# Altium footprint library 常用元件封装库.PcbLib: 1310 footprints (part 42 of 83)
Each footprint in its own frame and in the unit in brackets; x right, y up, seen from the top. Pads: shape width x height; smd on the part's side, far side on the other; paste and mask are expansions set on the pad; w line width, h text height; cw(c..) or ccw(c..) is an arc to the next point about the centre after c.
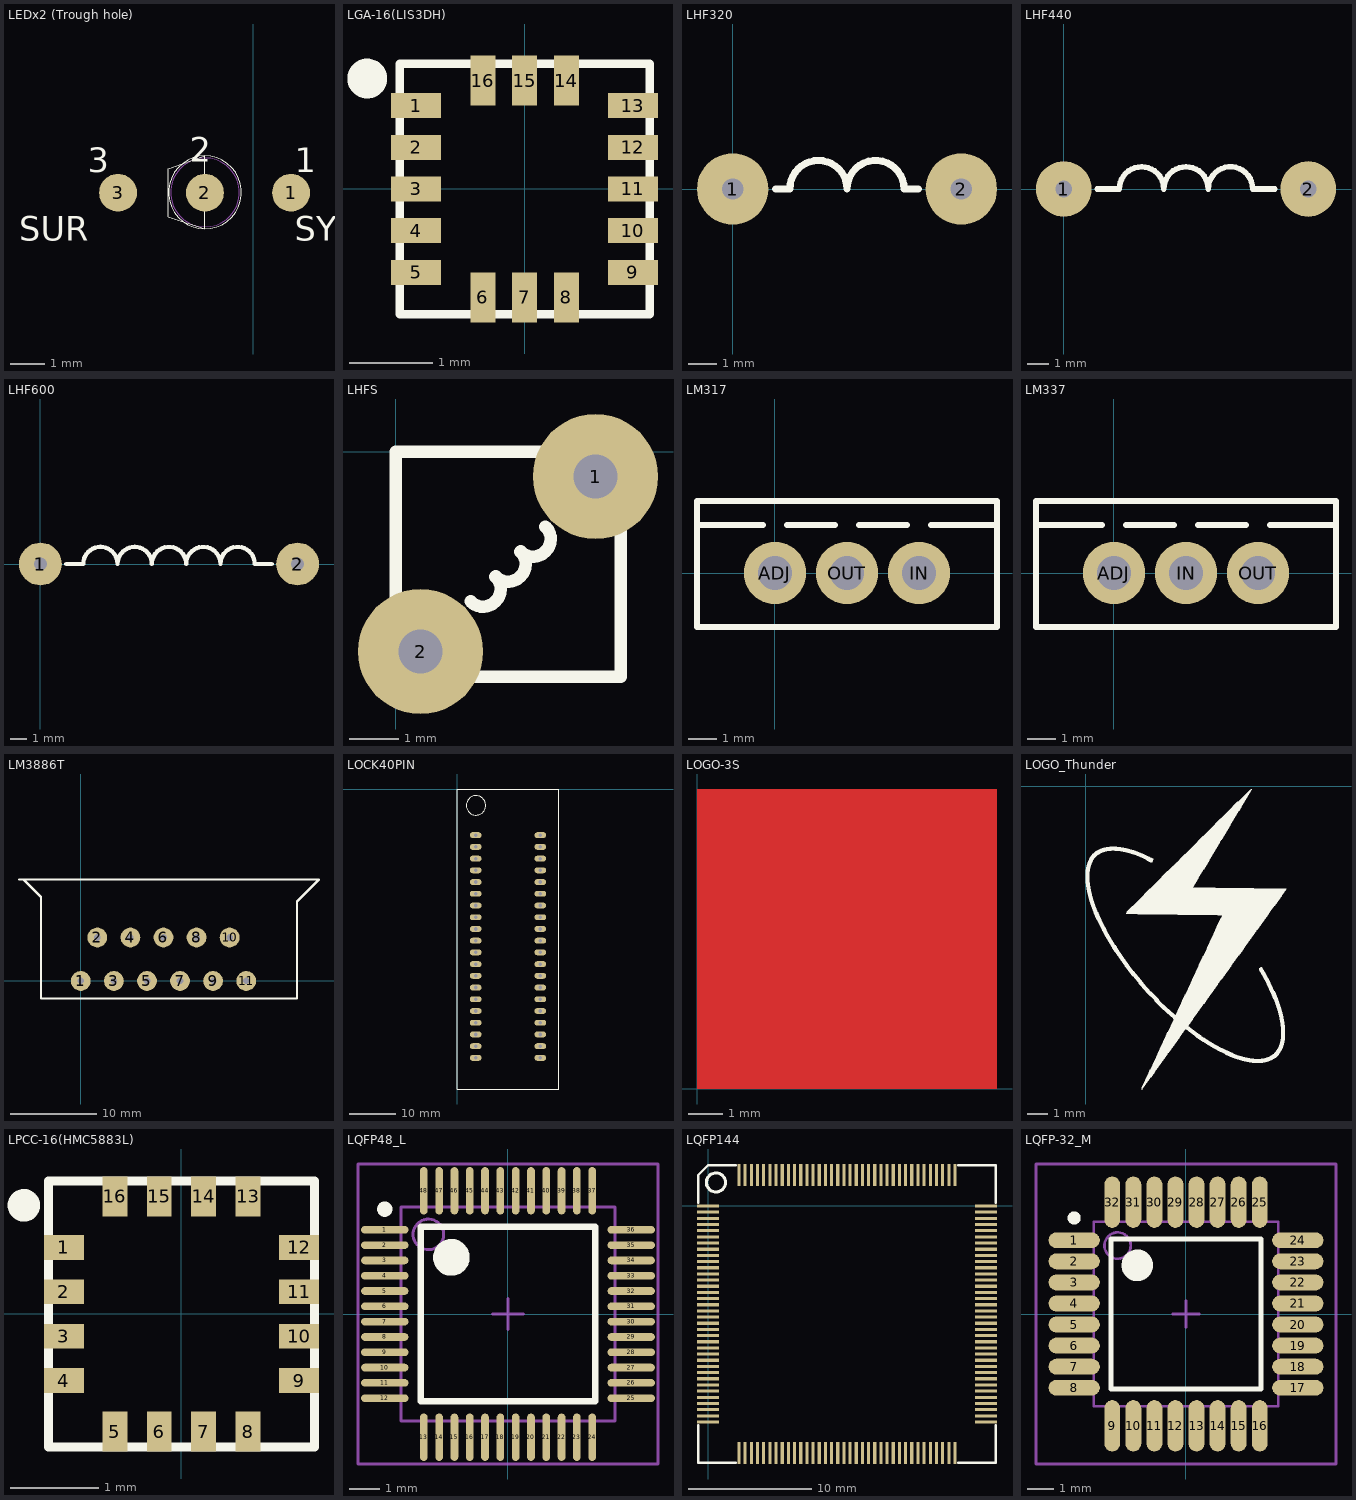
[diagram p41: the footprints below, top view; thin cyan lines are the x and y axes]

## LEDx2 (Trough hole) [mm]
pads (3):
  round 1.1 smd: 1(1.091,-6.706) 2(-1.409,-6.706) 3(-3.933,-6.706)
Top Overlay:
  lines w0.025: -2.469,-7.406 -2.469,-6.006 -1.409,-5.636 -1.409,-7.746 -2.469,-7.406 ; -1.409,-7.757 ccw(c-1.409,-6.698) -1.409,-5.639 ccw(c-1.409,-6.698) -1.409,-7.757
  text "2" at -1.851,-5.801 h0.71
  text "1" at 1.191,-6.106 h0.71
  text "3" at -4.809,-6.106 h0.71
  text "SUR" at -6.809,-8.106 h0.71
  text "SYG" at 1.191,-8.106 h0.71
Mechanical 2:
  lines w0.025: -1.409,-7.698 ccw(c-1.409,-6.698) -1.409,-5.698 ccw(c-1.409,-6.698) -1.409,-7.698

## LGA-16(LIS3DH) [mm]
pads (16):
  rect 0.6x0.3 smd: 1(-1.3,1) 2(-1.3,0.5) 3(-1.3,0) 4(-1.3,-0.5) 5(-1.3,-1) 9(1.3,-1) 10(1.3,-0.5) 11(1.3,0) 12(1.3,0.5) 13(1.3,1)
  rect 0.3x0.6 smd: 6(-0.5,-1.3) 7(0,-1.3) 8(0.5,-1.3) 14(0.5,1.3) 15(0,1.3) 16(-0.5,1.3)
Top Overlay:
  circle w0.254: c-1.887,1.325 r0.112
  lines w0.102: -1.5,-1.5 1.5,-1.5 1.5,1.5 -1.5,1.5 -1.5,-1.5

## LHF320 [mil]
pads (2):
  round 100 hole 30: 1(0,0) 2(320,0)
Top Overlay:
  lines w10: 60,0 80,0 cw(c120,0) 120,40 cw(c120,0) 160,0 cw(c200,0) 240,0 260,0

## LHF440 [mil]
pads (2):
  round 100 hole 30: 1(0,0) 2(440,0)
Top Overlay:
  lines w10: 60,0 100,0 cw(c140,0) 140,40 cw(c140,0) 180,0 cw(c220,0) 220,40 cw(c220,0) 260,0 cw(c300,0) 340,0 380,0

## LHF600 [mil]
pads (2):
  round 100 hole 30: 1(0,0) 2(600,0)
Top Overlay:
  lines w10: 60,0 100,0 cw(c140,0) 140,40 cw(c140,0) 180,0 cw(c220,0) 220,40 cw(c220,0) 260,0 cw(c300,0) 340,0 cw(c380,0) 420,0 cw(c460,0) 500,0 540,0

## LHFS [mil]
pads (2):
  round 100 hole 35: 1(160,-20) 2(20,-160)
Top Overlay:
  lines w10: 60,-120 ccw(c70,-110) 80,-100 ccw(c90,-90) 100,-80 ccw(c110,-70) 120,-60 ; 0,-180 0,0 180,0 180,-180 0,-180

## LM317 [mm]
pads (3):
  round 2.2 hole 1.2: ADJ(0,0) IN(5.08,0) OUT(2.54,0)
Top Overlay:
  lines w0.2: -2.752,1.693 -0.423,1.693 ; 0.423,1.693 2.117,1.693 ; 2.963,1.693 4.657,1.693 ; 5.503,1.693 7.832,1.693 ; -2.752,-1.905 -2.752,2.54 7.832,2.54 7.832,-1.905 -2.752,-1.905

## LM337 [mm]
pads (3):
  round 2.2 hole 1.2: ADJ(0,0) IN(2.54,0) OUT(5.08,0)
Top Overlay:
  lines w0.2: -2.752,1.693 -0.423,1.693 ; 0.423,1.693 2.117,1.693 ; 2.963,1.693 4.657,1.693 ; 5.503,1.693 7.832,1.693 ; -2.752,-1.905 7.832,-1.905 7.832,2.54 -2.752,2.54 -2.752,-1.905

## LM3886T [mil]
pads (11):
  round 90 hole 30: 1(0,0) 2(75,196.85) 3(150,0) 4(225,196.85) 5(300,0) 6(375,196.85) 7(450,0) 8(525,196.85) 9(600,0) 10(675,196.85) 11(750,0)
Top Overlay:
  lines w10: -180,-60 -180,380 -260,460 -280,460 0,460 ; -180,0 -180,-80 -120,-80 980,-80 980,360 1080,460 -100,460

## LOCK40PIN [mm] "green lock IC"
pads (40):
  oval 2.54x1.27 hole 0.8: 1(4,-10) 2(4,-12.54) 3(4,-15.08) 4(4,-17.62) 5(4,-20.16) 6(4,-22.7) 7(4,-25.24) 8(4,-27.78) 9(4,-30.32) 10(4,-32.86) 11(4,-35.4) 12(4,-37.94) 13(4,-40.48) 14(4,-43.02) 15(4,-45.56) 16(4,-48.1) 17(4,-50.64) 18(4,-53.18) 19(4,-55.72) 20(4,-58.26) 21(18,-58.26) 22(18,-55.72) 23(18,-53.18) 24(18,-50.64) 25(18,-48.1) 26(18,-45.56) 27(18,-43.02) 28(18,-40.48) 29(18,-37.94) 30(18,-35.4) 31(18,-32.86) 32(18,-30.32) 33(18,-27.78) 34(18,-25.24) 35(18,-22.7) 36(18,-20.16) 37(18,-17.62) 38(18,-15.08) 39(18,-12.54) 40(18,-10)
Top Overlay:
  circle w0.254: c4.064,-3.556 r2.095
  lines w0.254: 0,-65 0,0 22,0 22,-65 0,-65

## LOGO-3S [mil]
Top Layer:
  rectangle: 0,0 346.46,346.46
Top Paste:
  circle w70.87: c173.19,173.26 r47.5
  region: 93.83,117.8 8.09,117.8 8.09,143.91 78.22,156.07 79.2,150.12 80.59,145.45 82.05,141.29 85.12,133.32 88.48,126.46
  region: 251.89,228.35 337.63,228.35 337.63,202.24 267.5,190.09 266.52,196.03 265.13,200.7 263.67,204.87 260.6,212.83 257.24,219.7
  region: 8.01,183.21 77.46,183.21 77.46,183.22 77.15,181.35 76.87,177.91 76.71,173.85 76.79,169.45 77.16,165.38 77.78,163.26 8,163.26
  region: 338.08,163.28 268.63,163.28 268.63,163.27 268.94,165.14 269.22,168.58 269.38,172.64 269.3,177.04 268.93,181.11 268.31,183.23 338.08,183.23
  region: 335.63,117.82 251.52,117.82 251.52,117.84 255.04,122.85 258.57,129.47 260.98,134.42 263.27,140.66 263.96,142.93 337.83,155.63 337.83,145.35 337.25,132.43 336.34,121.66
  region: 338.42,235.74 247.4,235.74 243.24,239.91 239.75,243.41 233.95,248.41 225.72,254.51 213.69,260.97 204.14,264.69 194.8,267.16 184.32,269.11 174.81,269.73 165.03,269.55 154.51,267.92 145.92,265.7 134.25,261.37 125.71,256.46 116.24,250.84 101.2,236.82 12.84,236.82 12.84,236.78 15.82,246.92 20.31,258.33 27.94,272.24 35.47,283.86 45.59,295.41 58.48,307.32 74.2,318.69 89.54,326.55 106.21,332.8 121.17,336.59 141.06,338.76 338.43,338.76
  region: 10.14,228.35 94.24,228.35 94.24,228.33 90.72,223.32 87.19,216.7 84.79,211.75 82.49,205.51 81.8,203.24 7.93,190.54 7.93,200.82 8.51,213.74 9.42,224.51
  region: 7.98,110.76 99,110.76 103.17,106.59 106.66,103.09 112.45,98.09 120.68,91.99 132.71,85.53 142.27,81.81 151.6,79.33 162.09,77.39 171.6,76.77 181.37,76.95 191.9,78.58 200.48,80.79 212.16,85.13 220.7,90.04 230.16,95.66 245.2,109.68 333.57,109.68 333.57,109.72 330.59,99.58 326.1,88.17 318.46,74.25 310.94,62.64 300.81,51.09 287.92,39.17 272.2,27.81 256.86,19.95 240.19,13.7 225.23,9.91 205.34,7.73 7.98,7.73
Top Solder:
  circle w70.87: c173.16,173.34 r47.5
  region: 93.81,117.88 8.06,117.88 8.06,143.99 78.19,156.14 79.17,150.2 80.56,145.53 82.02,141.36 85.09,133.4 88.45,126.54
  region: 251.86,228.43 337.6,228.43 337.6,202.32 267.48,190.17 266.49,196.11 265.11,200.78 263.65,204.95 260.58,212.91 257.22,219.77
  region: 7.98,183.29 77.43,183.29 77.43,183.3 77.12,181.42 76.84,177.99 76.68,173.92 76.77,169.53 77.14,165.46 77.75,163.33 7.98,163.33
  region: 338.05,163.35 268.6,163.35 268.6,163.34 268.91,165.22 269.19,168.66 269.35,172.72 269.27,177.11 268.9,181.19 268.28,183.31 338.06,183.31
  region: 335.6,117.9 251.5,117.9 251.5,117.92 255.01,122.93 258.54,129.55 260.95,134.5 263.25,140.73 263.93,143.01 337.8,155.7 337.8,145.43 337.22,132.51 336.31,121.73
  region: 338.4,235.82 247.38,235.82 243.21,239.98 239.72,243.49 233.93,248.49 225.7,254.59 213.67,261.05 204.11,264.76 194.78,267.24 184.29,269.19 174.78,269.81 165.01,269.63 154.48,267.99 145.9,265.78 134.22,261.45 125.68,256.54 116.22,250.92 101.18,236.9 12.81,236.9 12.81,236.86 15.79,246.99 20.28,258.41 27.92,272.32 35.44,283.94 45.57,295.49 58.46,307.4 74.18,318.77 89.52,326.63 106.19,332.88 121.15,336.66 141.04,338.84 338.4,338.84
  region: 10.11,228.43 94.21,228.43 94.21,228.41 90.7,223.4 87.17,216.78 84.76,211.83 82.46,205.59 81.78,203.32 7.91,190.62 7.91,200.9 8.49,213.81 9.4,224.59
  region: 7.96,110.83 98.98,110.83 103.14,106.67 106.63,103.17 112.43,98.17 120.66,92.06 132.69,85.6 142.24,81.89 151.58,79.41 162.06,77.47 171.57,76.85 181.35,77.02 191.87,78.66 200.46,80.87 212.13,85.21 220.67,90.12 230.14,95.73 245.18,109.76 333.54,109.76 333.54,109.8 330.56,99.66 326.07,88.24 318.44,74.33 310.91,62.72 300.79,51.17 287.9,39.25 272.18,27.89 256.84,20.03 240.17,13.78 225.21,9.99 205.32,7.81 7.95,7.81

## LOGO_Thunder [mil]
Top Overlay:
  drawing of 2284 lines, arcs and shapes, not listed

## LPCC-16(HMC5883L) [mm]
pads (16):
  rect 0.45x0.28 smd: 1(-1.325,0.75) 2(-1.325,0.25) 3(-1.325,-0.25) 4(-1.325,-0.75) 9(1.325,-0.75) 10(1.325,-0.25) 11(1.325,0.25) 12(1.325,0.75)
  rect 0.28x0.45 smd: 5(-0.75,-1.325) 6(-0.25,-1.325) 7(0.25,-1.325) 8(0.75,-1.325) 13(0.75,1.325) 14(0.25,1.325) 15(-0.25,1.325) 16(-0.75,1.325)
Top Overlay:
  circle w0.254: c-1.775,1.225 r0.056
  lines w0.102: -1.5,-1.5 -1.5,1.5 1.5,1.5 1.5,-1.5 -1.5,-1.5

## LQFP48_L [mm] "Thin QFP, 48-Leads, Body 7x7mm, Pitch 0.5mm, IPC High Density"
height 1.6
pads (48):
  oval 1.55x0.25 smd: 1(-4.025,2.75) 2(-4.025,2.25) 3(-4.025,1.75) 4(-4.025,1.25) 5(-4.025,0.75) 6(-4.025,0.25) 7(-4.025,-0.25) 8(-4.025,-0.75) 9(-4.025,-1.25) 10(-4.025,-1.75) 11(-4.025,-2.25) 12(-4.025,-2.75) 25(4.025,-2.75) 26(4.025,-2.25) 27(4.025,-1.75) 28(4.025,-1.25) 29(4.025,-0.75) 30(4.025,-0.25) 31(4.025,0.25) 32(4.025,0.75) 33(4.025,1.25) 34(4.025,1.75) 35(4.025,2.25) 36(4.025,2.75)
  oval 0.25x1.55 smd: 13(-2.75,-4.025) 14(-2.25,-4.025) 15(-1.75,-4.025) 16(-1.25,-4.025) 17(-0.75,-4.025) 18(-0.25,-4.025) 19(0.25,-4.025) 20(0.75,-4.025) 21(1.25,-4.025) 22(1.75,-4.025) 23(2.25,-4.025) 24(2.75,-4.025) 37(2.75,4.025) 38(2.25,4.025) 39(1.75,4.025) 40(1.25,4.025) 41(0.75,4.025) 42(0.25,4.025) 43(-0.25,4.025) 44(-0.75,4.025) 45(-1.25,4.025) 46(-1.75,4.025) 47(-2.25,4.025) 48(-2.75,4.025)
Top Overlay:
  circle w0.25: c-4.025,3.425 r0.125
  circle w0.6: c-1.85,1.85 r0.3
  lines w0.2: -2.85,-2.85 -2.85,2.85 2.85,2.85 2.85,-2.85 -2.85,-2.85
Mechanical 13:
  circle w0.1: c-2.6,2.6 r0.5
  lines w0.1: -3.5,-3.5 -3.5,3.5 3.5,3.5 3.5,-3.5 -3.5,-3.5
Mechanical 15:
  lines w0.1: -0.5,0 0.5,0 ; 0,-0.5 0,0.5 ; -4.9,-4.9 -4.9,4.9 4.9,4.9 4.9,-4.9 -4.9,-4.9
3D body: height 1.6, standoff 0, extent -3.5,-3.5 3.5,3.5

## LQFP144 [mil]
pads (144):
  rect 70.87x10 smd: 1(-0.35,0.02) 2(-0.35,-19.66) 3(-0.35,-39.35) 4(-0.35,-59.03) 5(-0.35,-78.72) 6(-0.35,-98.4) 7(-0.35,-118.09) 8(-0.35,-137.77) 9(-0.35,-157.46) 10(-0.35,-177.14) 11(-0.35,-196.83) 12(-0.35,-216.51) 13(-0.35,-236.2) 14(-0.35,-255.88) 15(-0.35,-275.57) 16(-0.35,-295.25) 17(-0.35,-314.94) 18(-0.35,-334.62) 19(-0.35,-354.31) 20(-0.35,-373.99) 21(-0.35,-393.68) 22(-0.35,-413.36) 23(-0.35,-433.05) 24(-0.35,-452.73) 25(-0.35,-472.42) 26(-0.35,-492.1) 27(-0.35,-511.79) 28(-0.35,-531.47) 29(-0.35,-551.16) 30(-0.35,-570.84) 31(-0.35,-590.53) 32(-0.35,-610.21) 33(-0.35,-629.9) 34(-0.35,-649.58) 35(-0.35,-669.27) 36(-0.35,-688.95) 73(885.47,-688.95) 74(885.47,-669.27) 75(885.47,-649.58) 76(885.47,-629.9) 77(885.47,-610.21) 78(885.47,-590.53) 79(885.47,-570.84) 80(885.47,-551.16) 81(885.47,-531.47) 82(885.47,-511.79) 83(885.47,-492.1) 84(885.47,-472.42) 85(885.47,-452.73) 86(885.47,-433.05) 87(885.47,-413.36) 88(885.47,-393.68) 89(885.47,-373.99) 90(885.47,-354.31) 91(885.47,-334.62) 92(885.47,-314.94) 93(885.47,-295.25) 94(885.47,-275.57) 95(885.47,-255.88) 96(885.47,-236.2) 97(885.47,-216.51) 98(885.47,-196.83) 99(885.47,-177.14) 100(885.47,-157.46) 101(885.47,-137.77) 102(885.47,-118.09) 103(885.47,-98.4) 104(885.47,-78.72) 105(885.47,-59.03) 106(885.47,-39.35) 107(885.47,-19.66) 108(885.47,0.02)
  rect 10x70.87 smd: 37(98.07,-787.38) 38(117.76,-787.38) 39(137.44,-787.38) 40(157.13,-787.38) 41(176.81,-787.38) 42(196.5,-787.38) 43(216.18,-787.38) 44(235.87,-787.38) 45(255.55,-787.38) 46(275.24,-787.38) 47(294.92,-787.38) 48(314.61,-787.38) 49(334.29,-787.38) 50(353.98,-787.38) 51(373.66,-787.38) 52(393.35,-787.38) 53(413.03,-787.38) 54(432.72,-787.38) 55(452.4,-787.38) 56(472.09,-787.38) 57(491.77,-787.38) 58(511.46,-787.38) 59(531.14,-787.38) 60(550.83,-787.38) 61(570.51,-787.38) 62(590.2,-787.38) 63(609.88,-787.38) 64(629.57,-787.38) 65(649.25,-787.38) 66(668.94,-787.38) 67(688.62,-787.38) 68(708.31,-787.38) 69(727.99,-787.38) 70(747.68,-787.38) 71(767.36,-787.38) 72(787.05,-787.38) 109(787.05,98.45) 110(767.36,98.45) 111(747.68,98.45) 112(727.99,98.45) 113(708.31,98.45) 114(688.62,98.45) 115(668.94,98.45) 116(649.25,98.45) 117(629.57,98.45) 118(609.88,98.45) 119(590.2,98.45) 120(570.51,98.45) 121(550.83,98.45) 122(531.14,98.45) 123(511.46,98.45) 124(491.77,98.45) 125(472.09,98.45) 126(452.4,98.45) 127(432.72,98.45) 128(413.03,98.45) 129(393.35,98.45) 130(373.66,98.45) 131(353.98,98.45) 132(334.29,98.45) 133(314.61,98.45) 134(294.92,98.45) 135(275.24,98.45) 136(255.55,98.45) 137(235.87,98.45) 138(216.18,98.45) 139(196.5,98.45) 140(176.81,98.45) 141(157.13,98.45) 142(137.44,98.45) 143(117.76,98.45) 144(98.07,98.45)
Top Overlay:
  circle w10: c24.59,75 r30.41
  lines w7.87: -31.85,-698.79 -31.85,-818.87 88.23,-818.87 ; -31.85,9.87 -31.85,98.45 -0.35,129.94 88.23,129.94 ; 796.89,-818.87 916.97,-818.87 916.97,-698.79 ; 796.89,129.94 916.97,129.94 916.97,9.87

## LQFP-32_M [mm] "Thin QFP, 32-Leads, Body 7x7mm, Pitch 0.8mm, IPC Low Density"
height 1.6
pads (32):
  oval 1.95x0.6 smd: 1(-4.25,2.8) 2(-4.25,2) 3(-4.25,1.2) 4(-4.25,0.4) 5(-4.25,-0.4) 6(-4.25,-1.2) 7(-4.25,-2) 8(-4.25,-2.8) 17(4.25,-2.8) 18(4.25,-2) 19(4.25,-1.2) 20(4.25,-0.4) 21(4.25,0.4) 22(4.25,1.2) 23(4.25,2) 24(4.25,2.8)
  oval 0.6x1.95 smd: 9(-2.8,-4.25) 10(-2,-4.25) 11(-1.2,-4.25) 12(-0.4,-4.25) 13(0.4,-4.25) 14(1.2,-4.25) 15(2,-4.25) 16(2.8,-4.25) 25(2.8,4.25) 26(2,4.25) 27(1.2,4.25) 28(0.4,4.25) 29(-0.4,4.25) 30(-1.2,4.25) 31(-2,4.25) 32(-2.8,4.25)
Top Overlay:
  circle w0.25: c-4.25,3.65 r0.125
  circle w0.6: c-1.85,1.85 r0.3
  lines w0.2: -2.85,-2.85 -2.85,2.85 2.85,2.85 2.85,-2.85 -2.85,-2.85
Mechanical 13:
  circle w0.1: c-2.6,2.6 r0.5
  lines w0.1: -3.5,-3.5 -3.5,3.5 3.5,3.5 3.5,-3.5 -3.5,-3.5
Mechanical 15:
  lines w0.1: -0.5,0 0.5,0 ; 0,-0.5 0,0.5 ; -5.7,-5.7 -5.7,5.7 5.7,5.7 5.7,-5.7 -5.7,-5.7
3D body: height 1.6, standoff 0, extent -3.5,-3.5 3.5,3.5